# Altium integrated library AKN_PI_Library.IntLib: 35 symbols (part 1 of 2)
Pins are listed as number, name and electrical type; pins without a type are passive.

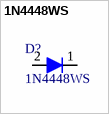
[diagram p0: symbol 1N4448WS]

## 1N4448WS
designator D?
1N4448WS SMD Small Signal Diode
footprint Diode_SOD-323
pins: 1, 2


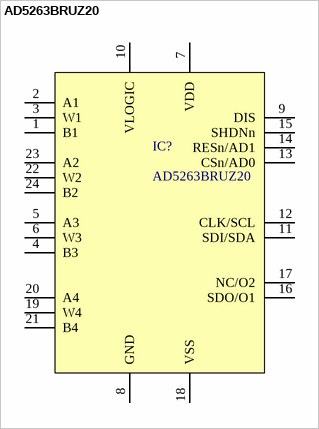
[diagram p1: symbol AD5263BRUZ20]

## AD5263BRUZ20
designator IC?
AD5263BRUZ20 Digital potentiometer
footprint TSSOP24 _(4.4mm)
pins: 1 B1, 2 A1, 3 W1, 4 B3, 5 A3, 6 W3, 7 VDD, 8 GND, 9 DIS, 10 VLOGIC, 11 SDI/SDA, 12 CLK/SCL, 13 CSn/AD0, 14 RESn/AD1, 15 SHDNn, 16 SDO/O1, 17 NC/O2, 18 VSS, 19 W4, 20 A4, 21 B4, 22 W2, 23 A2, 24 B2


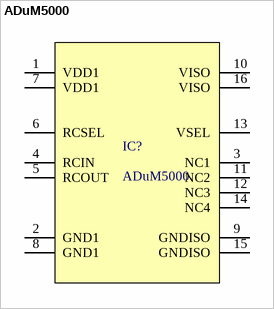
[diagram p2: symbol ADuM5000]

## ADuM5000
designator IC?
ADuM5000 Isolated DC-DC Converter
footprint SOIC_16W
pins: 1 VDD1, 2 GND1, 3 NC1, 4 RCIN, 5 RCOUT, 6 RCSEL, 7 VDD1, 8 GND1, 9 GNDISO, 10 VISO, 11 NC2, 12 NC3, 13 VSEL, 14 NC4, 15 GNDISO, 16 VISO


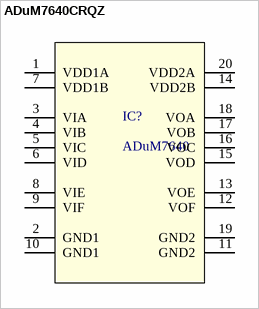
[diagram p3: symbol ADuM7640CRQZ]

## ADuM7640CRQZ
designator IC?, comment ADuM7640
ADuM7640 6-Channel Digital Isolators
footprint QSOP_20
pins: 1 VDD1A, 2 GND1, 3 VIA, 4 VIB, 5 VIC, 6 VID, 7 VDD1B, 8 VIE, 9 VIF, 10 GND1, 11 GND2, 12 VOF, 13 VOE, 14 VDD2B, 15 VOD, 16 VOC, 17 VOB, 18 VOA, 19 GND2, 20 VDD2A


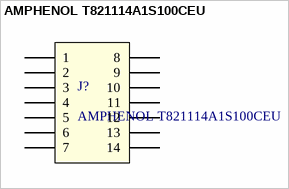
[diagram p4: symbol AMPHENOL T821114A1S100CEU]

## AMPHENOL T821114A1S100CEU
designator J?
AMPHENOL T821114A1S100CEU 14 PIN IDC Connector
footprint T821114A1S100CEU
pins: 1, 2, 3, 4, 5, 6, 7, 8, 9, 10, 11, 12, 13, 14


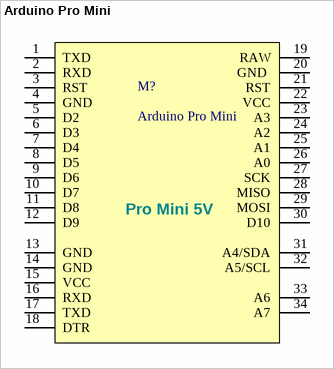
[diagram p5: symbol Arduino Pro Mini]

## Arduino Pro Mini
designator M?
Arduino Pro Mini 5V 16 MHz
footprint Arduino-pro-mini
pins: 1 TXD, 2 RXD, 3 RST, 4 GND, 5 D2, 6 D3, 7 D4, 8 D5, 9 D6, 10 D7, 11 D8, 12 D9, 13 GND, 14 GND, 15 VCC, 16 RXD, 17 TXD, 18 DTR, 19 RAW, 20 GND , 21 RST, 22 VCC, 23 A3, 24 A2, 25 A1, 26 A0, 27 SCK, 28 MISO, 29 MOSI, 30 D10, 31 A4/SDA, 32 A5/SCL, 33 A6, 34 A7
text: Pro Mini 5V


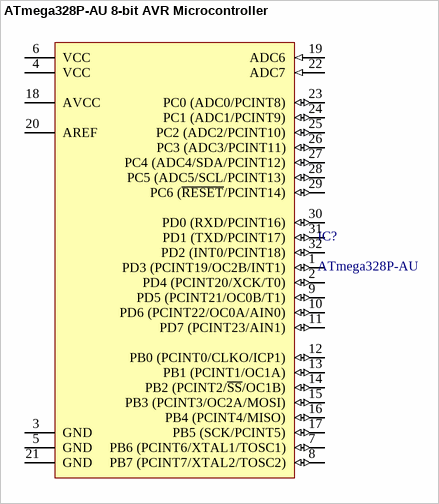
[diagram p6: symbol ATmega328P-AU 8-bit AVR Microcontroller]

## ATmega328P-AU 8-bit AVR Microcontroller
designator IC?, comment ATmega328P-AU
8-bit AVR Microcontroller- Microchip
footprint TQFP32
pins: 1 PD3 (PCINT19/OC2B/INT1) (io), 2 PD4 (PCINT20/XCK/T0) (io), 3 GND (power), 4 VCC (power), 5 GND (power), 6 VCC (power), 7 PB6 (PCINT6/XTAL1/TOSC1) (io), 8 PB7 (PCINT7/XTAL2/TOSC2) (io), 9 PD5 (PCINT21/OC0B/T1) (io), 10 PD6 (PCINT22/OC0A/AIN0) (io), 11 PD7 (PCINT23/AIN1) (io), 12 PB0 (PCINT0/CLKO/ICP1) (io), 13 PB1 (PCINT1/OC1A) (io), 14 PB2 (PCINT2/~{SS}/OC1B) (io), 15 PB3 (PCINT3/OC2A/MOSI) (io), 16 PB4 (PCINT4/MISO) (io), 17 PB5 (SCK/PCINT5) (io), 18 AVCC (power), 19 ADC6 (in), 20 AREF, 21 GND (power), 22 ADC7 (in), 23 PC0 (ADC0/PCINT8) (io), 24 PC1 (ADC1/PCINT9) (io), 25 PC2 (ADC2/PCINT10) (io), 26 PC3 (ADC3/PCINT11) (io), 27 PC4 (ADC4/SDA/PCINT12) (io), 28 PC5 (ADC5/SCL/PCINT13) (io), 29 PC6 (~{RESET}/PCINT14) (io), 30 PD0 (RXD/PCINT16) (io), 31 PD1 (TXD/PCINT17) (io), 32 PD2 (INT0/PCINT18) (io)


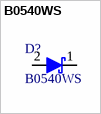
[diagram p7: symbol B0540WS]

## B0540WS
designator D?
B0540WS SURFACE MOUNT SCHOTTKY BARRIER RECTIFIER
footprint Diode_SOD-323
pins: 1, 2


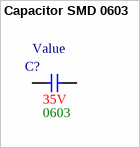
[diagram p8: symbol Capacitor SMD 0603]

## Capacitor SMD 0603
designator C?  Voltage: 35V  Package: 0603  (hidden comment: *)
Ceramic Capacitor SMD 0603; Tolerance: 10%; Value: Value
footprint Capacitor_0603
pins: 1, 2


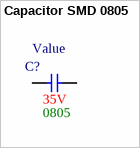
[diagram p9: symbol Capacitor SMD 0805]

## Capacitor SMD 0805
designator C?  Voltage: 35V  Package: 0805  (hidden comment: *)
Ceramic Capacitor SMD 0805; Tolerance: 10%; Value: Value
footprint Capacitor_0805
pins: 1, 2


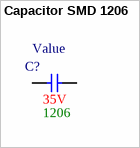
[diagram p10: symbol Capacitor SMD 1206]

## Capacitor SMD 1206
designator C?  Voltage: 35V  Package: 1206  (hidden comment: *)
Ceramic Capacitor SMD 1206; Tolerance: 10%; Value: Value
footprint CAP_SMD_1206
pins: 1, 2


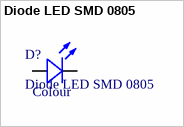
[diagram p11: symbol Diode LED SMD 0805]

## Diode LED SMD 0805
designator D?
Colour: Colour
footprint Diode_LED_SMD_0805
pins: A, C


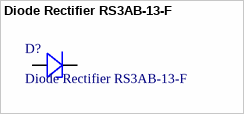
[diagram p12: symbol Diode Rectifier RS3AB-13-F]

## Diode Rectifier RS3AB-13-F
designator D?
RS3AB-13-F -Diode Standard 50V 3A Surface Mount SMB; MaxCurrent: Current
footprint DO214-AA
pins: A, C


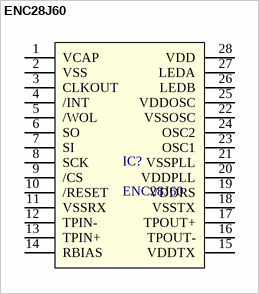
[diagram p13: symbol ENC28J60]

## ENC28J60
designator IC?
ENC28J60 - Stand-Alone Ethernet Controller  with SPI Interface
footprint SO-28W
pins: 1 VCAP, 2 VSS, 3 CLKOUT, 4 /INT, 5 /WOL, 6 SO, 7 SI, 8 SCK, 9 /CS, 10 /RESET, 11 VSSRX, 12 TPIN-, 13 TPIN+, 14 RBIAS, 15 VDDTX, 16 TPOUT-, 17 TPOUT+, 18 VSSTX, 19 VDDRS, 20 VDDPLL, 21 VSSPLL, 22 VSSOSC, 23 OSC1, 24 OSC2, 25 VDDOSC, 26 LEDB, 27 LEDA, 28 VDD


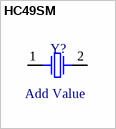
[diagram p14: symbol HC49SM]

## HC49SM
designator Y?  value Add Value  (hidden comment: HC49SM)  (mechanical)
HC49SM - Crystal oscilator
footprint HC49SM
pins: 1, 2


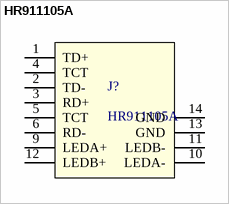
[diagram p15: symbol HR911105A]

## HR911105A
designator J?
HR911105A - Ethernet connector RJ45
footprint HR911105A
pins: 1 TD+, 2 TD-, 3 RD+, 4 TCT, 5 TCT, 6 RD-, 9 LEDA+, 10 LEDA-, 11 LEDB-, 12 LEDB+, 13 GND, 14 GND


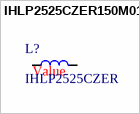
[diagram p16: symbol IHLP2525CZER150M01]

## IHLP2525CZER150M01
designator L?, comment IHLP2525CZER
Power Inductor IHLP2525 Series; Value: Value
footprint IND_IHLP2525
pins: 1, 2


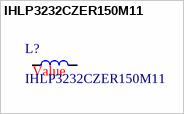
[diagram p17: symbol IHLP3232CZER150M11]

## IHLP3232CZER150M11
designator L?
Power inductor IHLP3232CZER Series; Value: Value
footprint INDP_IHLP32 (Precision Wire Wound Inductor, 2-Leads, Body 8.64mm x 8.18mm x 3mm)
pins: 1, 2


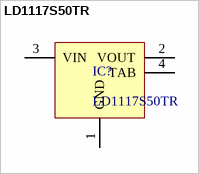
[diagram p18: symbol LD1117S50TR]

## LD1117S50TR
designator IC?
LD1117S50TR - Fixed low drop positive voltage regulator
footprint SOT-223 (SOT223, 4-Leads, Body 6.5x3.5mm, Pitch 2.3mm, Lead Span 7mm, IPC Medium Density)
pins: 1 GND (power), 2 VOUT (power), 3 VIN (power), 4 TAB (power)


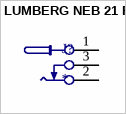
[diagram p19: symbol LUMBERG NEB 21 R]

## LUMBERG NEB 21 R
designator J?
LUMBERG NEB 21 R DC Power Connector
footprint LUMBERG_NEB_21R (LUMBERG NEB 21 R Connector)
pins: 1, 2, 3


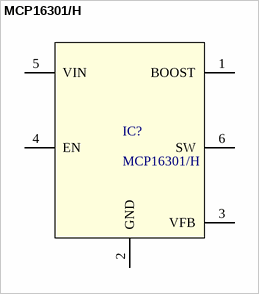
[diagram p20: symbol MCP16301/H]

## MCP16301/H
designator IC?
MCP16301/H High-Voltage Input Integrated Switch Step-Down Regulator
footprint SOT-23-6
pins: 1 BOOST, 2 GND, 3 VFB, 4 EN, 5 VIN, 6 SW


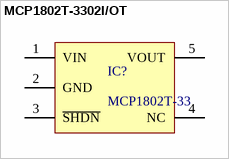
[diagram p21: symbol MCP1802T-3302I/OT]

## MCP1802T-3302I/OT
designator IC?, comment MCP1802T-33
MCP1802T-3302I/OT - 300 mA, High PSRR, Low Quiescent Current LDO
footprint SOT-23_5L
pins: 1 VIN "Low battery comparator input (comparator enabled with EN), may not be left floating, should be connected to GND or VBAT if comparator is not used", 2 GND (power) "Control / logic ground", 3 ~{SHDN} "Enable input. (1/VBAT enabled, 0/GND disabled)", 4 NC, 5 VOUT (power) "Boost converter output"


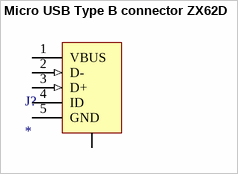
[diagram p22: symbol Micro USB Type B connector ZX62D]

## Micro USB Type B connector ZX62D
designator J?
Micro USB Type B connector - ZX62D-B-5PA8
footprint ZX62D-B-5PA8 (Connector THT USB-B Right Angle  ZX62D-B-5PA8)
pins: 0 SHLD "Shield", 1 VBUS (power) "Power", 2 D- (in) "-DATA", 3 D+ (in) "+DATA", 4 ID (power) "Ground", 5 GND (power) "Ground"
